# Altium footprint library THU VIEN PCB.PCBLib: 534 footprints (part 16 of 34)
Each footprint in its own frame and in the unit in brackets; x right, y up, seen from the top. Pads: shape width x height; smd on the part's side, far side on the other; paste and mask are expansions set on the pad; w line width, h text height; cw(c..) or ccw(c..) is an arc to the next point about the centre after c.
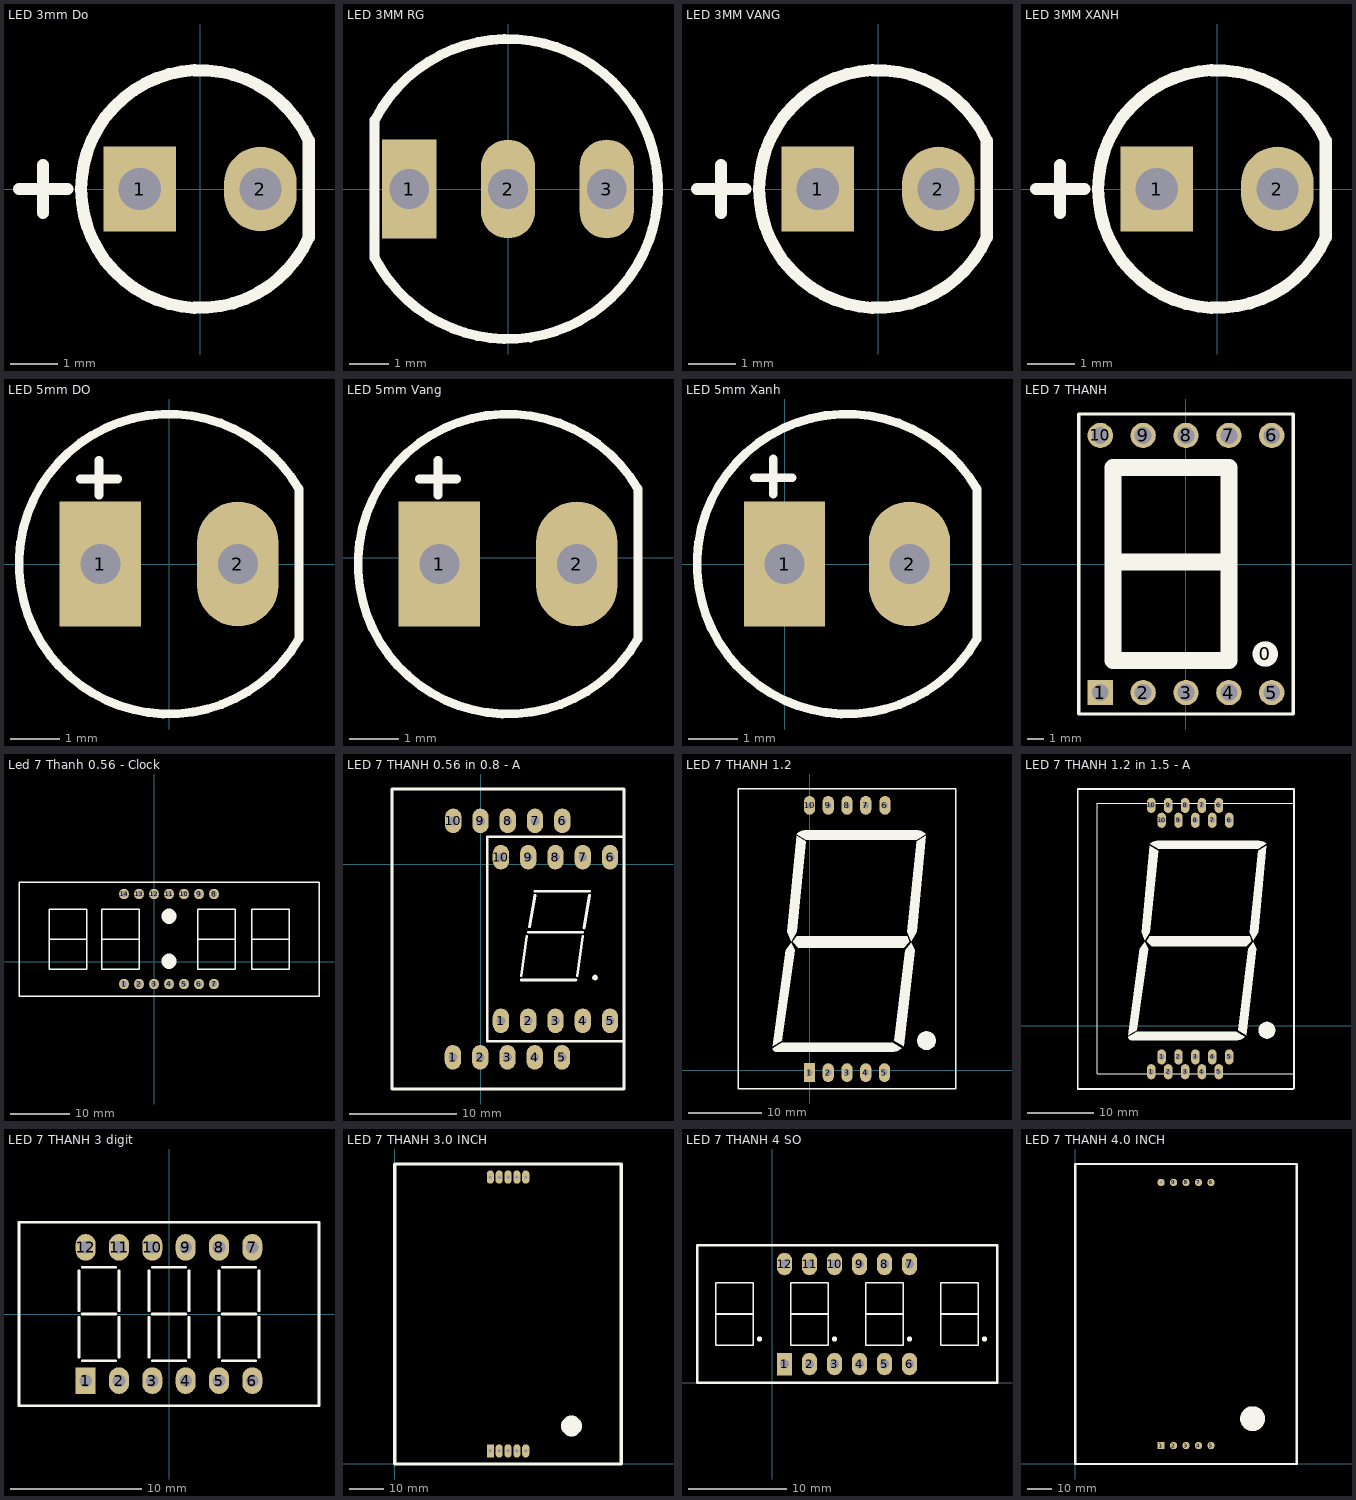
[diagram p15: the footprints below, top view; thin cyan lines are the x and y axes]

## LED 3mm Do [mil] "Footprintf LED phi 3"
pads (2):
  rect 60x70 hole 35: 1(-50,0)
  oval 60x70 hole 35: 2(50,0)
Top Overlay:
  lines w10: -150,0 -110,0 ; -130,-20 -130,20 ; 90,-40 cw(c0,0) 90,40 90,-40
3D body "Led 3mm Do.STEP.step": height 205.32, standoff -117.51, extent -77.16,-78.45 60,78.47

## LED 3MM RG [mil]
pads (3):
  rect 55x100 hole 40: 1(-100,0)
  oval 55x100 hole 40: 2(0,0) 3(100,0)
Top Overlay:
  lines w10: -135,-70 -135,70 ; -134.81,-69.9 ccw(c0,0) -134.59,70.33
3D body "User Library-LED RG.step": height 311.26, standoff -217.48, extent -88.58,-78.74 88.58,78.74

## LED 3MM VANG [mil]
pads (2):
  rect 60x70 hole 35: 1(-50,0)
  oval 60x70 hole 35: 2(50,0)
Top Overlay:
  lines w10: -150,0 -140,0 -110,0 ; -130,-20 -130,20 ; 90,-40 cw(c0,0) 90,40 90,-40
3D body "Led 3mm Vang.step": height 205.33, standoff -117.51, extent -77.16,-78.45 60,78.47

## LED 3MM XANH [mil]
pads (2):
  rect 60x70 hole 35: 1(-50,0)
  oval 60x70 hole 35: 2(50,0)
Top Overlay:
  lines w10: -150,0 -110,0 -140,0 ; -130,-20 -130,20 ; 90,-40 cw(c0,0) 90,40 90,-40
3D body "Led 3mm Xanh.step": height 205.33, standoff -117.51, extent -77.16,-78.46 60,78.46

## LED 5mm DO [mil] "LED 2 PIN, 5 ly , Only colour, pin to pin 110mil"
height 300
pads (2):
  rect 65x100 hole 32: 1(-55,0)
  oval 65x100 hole 32: 2(55,0)
Top Overlay:
  lines w7: -71,68 -41,68 ; -56,55 -56,83 ; 103.51,60.71 ccw(c0,0) 103.94,-59.97 ; 104,-59 104,60
3D body "SW3dPS-LEDd5R.STEP": height 339.18, standoff -243.49, extent -115.69,-117 97.7,120

## LED 5mm Vang [mil]
pads (2):
  rect 65x100 hole 32: 1(175,-5)
  oval 65x100 hole 32: 2(285,-5)
Top Overlay:
  lines w7: 159,63 189,63 ; 174,50 174,78 ; 333.51,55.71 ccw(c230,-5) 333.94,-64.97 ; 334,-64 334,55
3D body "Led 5mm yellow .STEP": height 339.75, standoff -242.93, extent 113.31,-125 326.7,111.99

## LED 5mm Xanh [mil] "LED 2 PIN, 5 ly , Only colour,pin to pin 100mil"
height 300
pads (2):
  rect 65x100 hole 32: 1(0,0)
  oval 65x100 hole 32: 2(100,0)
Top Overlay:
  lines w7: -24,69 6,69 ; -9,56 -9,84 ; 153.51,60.71 ccw(c50,0) 153.94,-59.97 ; 154,-59 154,60
3D body "SW3dPS-LED green.STEP": height 336.82, standoff -117.51, extent -54.33,-103.65 154.33,105.01

## LED 7 THANH [mm] "LED7SEG"
pads (11):
  round 1.524 on Top Overlay: 0(4.724,-5.334)
  rect 1.5x1.5 hole 1: 1(-5.055,-7.62)
  round 1.5 hole 1: 2(-2.515,-7.62) 3(0.025,-7.62) 4(2.565,-7.62) 5(5.105,-7.62) 6(5.105,7.62) 7(2.565,7.62) 8(0.025,7.62) 9(-2.515,7.62) 10(-5.055,7.62)
Top Overlay:
  lines w0.2: -6.325,-8.89 6.375,-8.89 6.375,8.89 -6.325,8.89 -6.325,-8.89
  lines w1: -4.166,0.127 2.565,0.127 ; -4.293,-5.715 -4.293,5.715 2.565,5.715 2.565,-5.715 -4.293,-5.715
3D body "SW3DPS-7SEGMENT DISPLAY.STEP": height 8.03, standoff -3.97, extent -6.35,-9.525 6.35,9.525

## Led 7 Thanh 0.56 - Clock [mil]
pads (14):
  oval 65x70 hole 40: 1(-200,-150) 2(-100,-150) 3(0,-150) 4(100,-150) 5(200,-150) 6(300,-150) 7(400,-150) 8(400,450) 9(300,450) 10(200,450) 11(100,450) 12(0,450) 13(-100,450) 14(-200,450)
Top Overlay:
  lines w10: -700,150 -450,150 ; -350,150 -100,150 ; 290,150 540,150 ; 650,150 900,150 ; -900,-230 1100,-230 1100,530 -900,530 -900,-230 ; -700,-50 -700,350 -450,350 -450,-50 -700,-50 ; -350,-50 -350,350 -100,350 -100,-50 -350,-50 ; 290,-50 290,350 540,350 540,-50 290,-50 ; 650,-50 650,350 900,350 900,-50 650,-50
  lines w100: 100,0 ccw(c72,4) 100.28,4 ; 100,300 ccw(c72,304) 100.28,304
3D body "7seg clock.step": height 280.13, standoff -196.25, extent -890.15,-224.01 1090.16,524.02

## LED 7 THANH 0.56 in 0.8 - A [mil]
pads (20):
  oval 60x90 hole 32: 1(-102,-709) 1(74,-575) 2(-2,-709) 2(174,-575) 3(98,-709) 3(274,-575) 4(198,-709) 4(374,-575) 5(298,-709) 5(474,-575) 6(299,158) 6(474,25) 7(199,158) 7(374,25) 8(99,158) 8(274,25) 9(-1,158) 9(174,25) 10(-101,158) 10(74,25)
Top Overlay:
  region: 429.56,-416.69 429.56,-418.67 428.03,-422.35 425.22,-425.16 421.54,-426.69 419.56,-426.69 417.57,-426.69 413.89,-425.16 411.08,-422.35 409.56,-418.67 409.56,-416.69 409.56,-414.7 411.08,-411.02 413.89,-408.21 417.57,-406.69 419.56,-406.69 421.54,-406.69 425.22,-408.21 428.03,-411.02 429.56,-414.7
  lines w10: 149,-425 349,-425 ; 149,-410 169,-265 ; 174,-250 374,-250 ; 179,-230 199,-115 ; 199,-100 399,-100 ; 354,-410 374,-265 ; 379,-235 399,-115 ; -325,-825 -325,275 525,275 525,-825 -325,-825 ; 24,-650 24,100 524,100 524,-650 24,-650

## LED 7 THANH 1.2 [mil] "DIP 10 Leads; Body 29 x 41 mm; Pitch 0.5 mm"
height 300
pads (10):
  rect 60x100 hole 32: 1(0,-12.5)
  oval 60x100 hole 32: 2(100,-12.5) 3(200,-12.5) 4(300,-12.5) 5(400,-12.5) 6(402.5,1412.5) 7(300,1412.5) 8(200,1412.5) 9(100,1412.5) 10(0,1412.5)
Top Overlay:
  region: -98.43,679.13 -127.95,639.76 -196.85,127.95 -147.64,157.48 -78.74,639.76
  region: 541.34,679.13 561.02,639.76 501.97,127.95 452.76,157.48 511.81,639.76
  region: 492.13,118.11 487.45,113.43 476.44,106.07 464.21,101.01 451.22,98.43 444.6,98.43 -177.17,98.43 -181.08,98.43 -188.32,101.42 -193.85,106.96 -196.85,114.19 -196.85,118.11 -147.64,147.64 442.91,147.64
  region: -88.58,684.06 -68.9,713.58 521.65,713.58 531.5,684.06 501.97,654.53 -59.06,654.53
  region: -68.9,1250 -19.68,1220.47 -68.9,738.19 -98.43,688.98 -118.11,738.19
  region: 620.08,1250 570.87,1220.47 521.65,738.19 541.34,688.98 570.87,738.19
  region: -68.9,1259.84 -64.22,1264.52 -53.21,1271.88 -40.98,1276.94 -27.99,1279.53 -21.37,1279.53 572.55,1279.53 579.17,1279.53 592.16,1276.94 604.39,1271.88 615.4,1264.52 620.08,1259.84 570.87,1230.32 -19.68,1230.32
  region: 623.5,207.11 628.34,207.11 637.85,205.22 646.81,201.51 654.87,196.13 661.72,189.27 667.11,181.21 670.82,172.26 672.71,162.75 672.71,157.9 672.71,153.05 670.82,143.55 667.11,134.59 661.72,126.53 654.87,119.68 646.81,114.29 637.85,110.58 628.34,108.69 623.5,108.69 618.65,108.69 609.14,110.58 600.19,114.29 592.13,119.68 585.27,126.53 579.89,134.59 576.18,143.55 574.29,153.05 574.29,157.9 574.29,162.75 576.18,172.26 579.89,181.21 585.27,189.27 592.13,196.13 600.19,201.51 609.14,205.22 618.65,207.11
  lines w7: -380,-100 780,-100 780,1500 -380,1500 -380,-100

## LED 7 THANH 1.2 in 1.5 - A [mil]
pads (20):
  oval 50x90 hole 32: 1(1135,-273) 1(1196,-185) 2(1235,-273) 2(1296,-185) 3(1335,-273) 3(1396,-185) 4(1435,-273) 4(1496,-185) 5(1535,-273) 5(1596,-185) 6(1535,1303) 6(1596,1215) 7(1435,1303) 7(1496,1215) 8(1335,1303) 8(1396,1215) 9(1235,1303) 9(1296,1215) 10(1135,1303) 10(1196,1215)
Top Overlay:
  region: 1819.5,22.11 1824.34,22.11 1833.85,20.22 1842.81,16.51 1850.87,11.13 1857.72,4.27 1863.11,-3.79 1866.82,-12.74 1868.71,-22.25 1868.71,-27.1 1868.71,-31.95 1866.82,-41.45 1863.11,-50.41 1857.72,-58.47 1850.87,-65.32 1842.81,-70.71 1833.85,-74.42 1824.34,-76.31 1819.5,-76.31 1814.65,-76.31 1805.14,-74.42 1796.19,-70.71 1788.13,-65.32 1781.27,-58.47 1775.89,-50.41 1772.18,-41.45 1770.29,-31.95 1770.29,-27.1 1770.29,-22.25 1772.18,-12.74 1775.89,-3.79 1781.27,4.27 1788.13,11.13 1796.19,16.51 1805.14,20.22 1814.65,22.11
  region: 1127.1,1074.84 1131.78,1079.52 1142.79,1086.88 1155.02,1091.94 1168.01,1094.53 1174.63,1094.53 1768.55,1094.53 1775.17,1094.53 1788.16,1091.94 1800.39,1086.88 1811.4,1079.52 1816.08,1074.84 1766.87,1045.32 1176.32,1045.32
  region: 1816.08,1065 1766.87,1035.47 1717.65,553.19 1737.34,503.98 1766.87,553.19
  region: 1127.1,1065 1176.32,1035.47 1127.1,553.19 1097.57,503.98 1077.89,553.19
  region: 1107.42,499.06 1127.1,528.58 1717.65,528.58 1727.5,499.06 1697.97,469.53 1136.94,469.53
  region: 1688.13,-66.89 1683.45,-71.57 1672.44,-78.93 1660.21,-83.99 1647.22,-86.57 1640.6,-86.57 1018.83,-86.57 1014.92,-86.57 1007.68,-83.58 1002.15,-78.04 999.15,-70.81 999.15,-66.89 1048.36,-37.36 1638.91,-37.36
  region: 1737.34,494.13 1757.02,454.76 1697.97,-57.05 1648.76,-27.52 1707.81,454.76
  region: 1097.57,494.13 1068.05,454.76 999.15,-57.05 1048.36,-27.52 1117.26,454.76
  lines w7: 816,-285 816,1315 1981,1315 1981,-285 816,-285
  lines w10: 1975,1400 700,1400 700,-375 1975,-375 1980,-370 1980,1400

## LED 7 THANH 3 digit [mil] "DIP; 14 Leads (2 Absent); Row Spacing 7.62 mm; Pitch 2.54 mm"
height 165.35
pads (12):
  rect 60x80 hole 38: 1(-250,-200)
  oval 60x80 hole 38: 2(-150,-200) 3(-50,-200) 4(50,-200) 5(150,-200) 6(250,-200) 7(250,200) 8(150,200) 9(50,200) 10(-50,200) 11(-150,200) 12(-250,200)
Top Overlay:
  lines w8: -270,-130 -270,-10 ; -270,10 -270,130 ; -260,-140 -160,-140 ; -260,0 -160,0 ; -260,140 -160,140 ; -150,-130 -150,-10 ; -150,10 -150,130 ; -60,-130 -60,-10 ; -60,10 -60,130 ; -50,-140 50,-140 ; -50,0 50,0 ; -50,140 50,140 ; 60,-130 60,-10 ; 60,10 60,130 ; 150,-130 150,-10 ; 150,10 150,130 ; 160,-140 260,-140 ; 160,0 260,0 ; 160,140 260,140 ; 270,-130 270,-10 ; 270,10 270,130 ; -450,-275 450,-275 450,275 -450,275 -450,-275
3D body "led 7 seg 0.36x3.step": height 284.26, standoff -119.4, extent -442.88,-278.56 446.89,276.56

## LED 7 THANH 3.0 INCH [mm]
pads (10):
  rect 2.032x3.81 hole 1: 1(27.425,3.75)
  oval 2.032x3.81 hole 1: 2(29.965,3.75) 3(32.505,3.75) 4(35.045,3.75) 5(37.585,3.75) 6(37.585,82.25) 7(35.045,82.25) 8(32.505,82.25) 9(29.965,82.25) 10(27.425,82.25)
Top Overlay:
  circle w3: c50.699,10.914 r1.477
  lines w1: 0,0 65,0 65,86 0,86 0,0
3D body "User Library-7segx1-SA30-18-2.step": height 12.01, standoff -2.99, extent 0.012,-0.021 65.012,85.979

## LED 7 THANH 4 SO [mil] "LED7seg4"
pads (12):
  rect 60x90 hole 35: 1(50,75)
  oval 60x90 hole 35: 2(150,75) 3(250,75) 4(350,75) 5(450,75) 6(550,75) 7(550,475) 8(450,475) 9(350,475) 10(250,475) 11(150,475) 12(50,475)
Top Overlay:
  circle w10: c-50,175 r5
  circle w10: c250,175 r5
  circle w10: c550,175 r5
  circle w10: c850,175 r5
  lines w7: -225,275 -75,275 ; -75,162.07 -75,400 ; 75,275 225,275 ; 375,275 525,275 ; 675,275 825,275 ; -75,400 -225,400 -225,150 -75,150 -75,400 ; 75,150 75,400 225,400 225,150 75,150 ; 375,150 375,400 525,400 525,150 375,150 ; 675,150 825,150 825,400 675,400 675,150
  lines w10: -300,0 -300,75 -300,550 -265,550 900,550 900,0 -300,0
3D body "7seg x 4 0.36.STEP": height 300, standoff -219.69, extent -290.55,-1.18 890.55,550

## LED 7 THANH 4.0 INCH [mm]
height 1.27
pads (10):
  rect 3x3 hole 1: 1(34.849,7.493)
  round 3 hole 1: 2(39.929,7.493) 3(45.009,7.493) 4(50.089,7.493) 5(55.169,7.493) 6(55.169,114.493) 7(50.089,114.493) 8(45.009,114.493) 9(39.929,114.493) 10(34.849,114.493)
Top Overlay:
  circle w5: c72.075,18.425 r2.54
  lines w1: 0,121.996 90,121.996 ; 0.009,122 0.009,-0.007 90,-0.007 ; 90,0 90,122
3D body "SW3dPS-Disp_SA40-18.STEP": height 15.01, standoff -6.99, extent -0.015,-0.025 89.985,121.975